# Altium footprint library 9-Pcblib_Con.PcbLib: 266 footprints (part 14 of 17)
Each footprint in its own frame and in the unit in brackets; x right, y up, seen from the top. Pads: shape width x height; smd on the part's side, far side on the other; paste and mask are expansions set on the pad; w line width, h text height; cw(c..) or ccw(c..) is an arc to the next point about the centre after c.
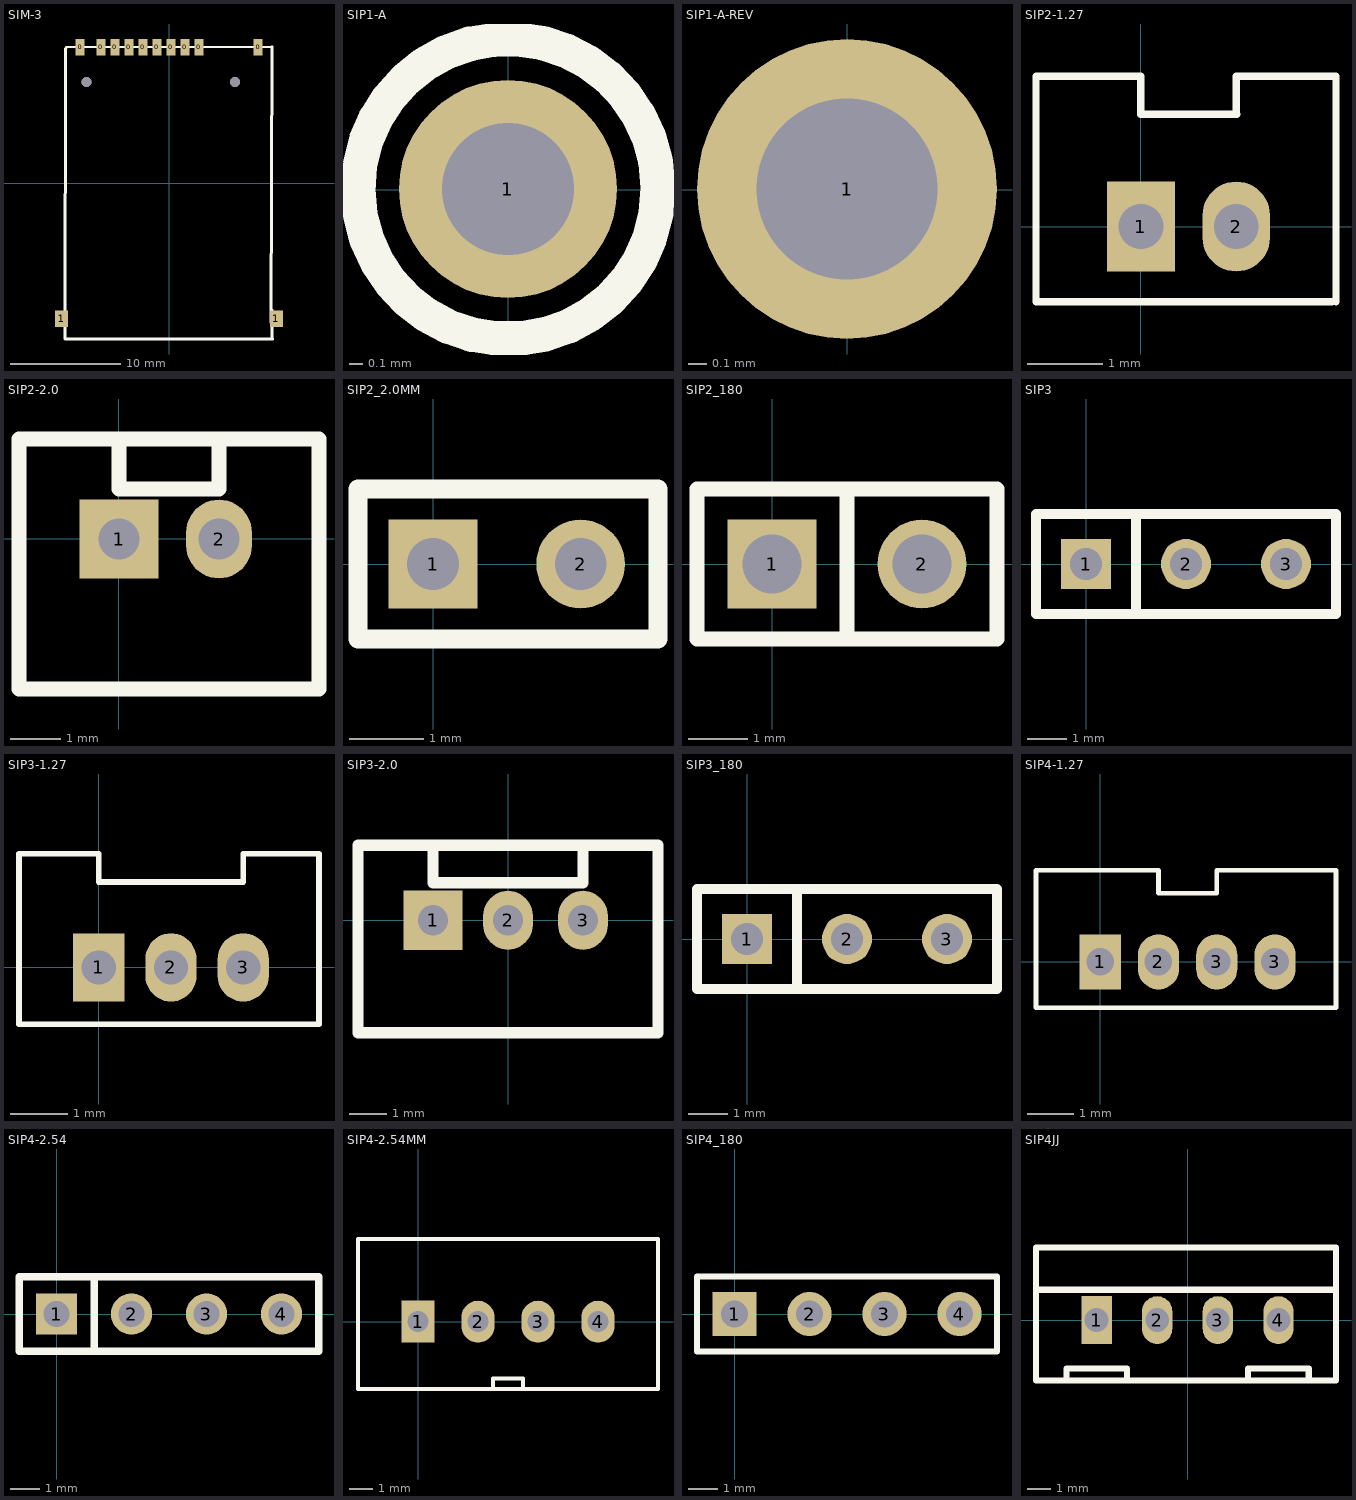
[diagram p13: the footprints below, top view; thin cyan lines are the x and y axes]

## SIM-3 [mm]
pads (12):
  rect 0.8x1.5 smd: 0(-8.07,12.325) 0(-6.17,12.325) 0(-4.9,12.325) 0(-3.63,12.325) 0(-2.36,12.325) 0(-1.09,12.325) 0(0.18,12.325) 0(1.45,12.325) 0(2.72,12.325) 0(8.08,12.325)
  rect 1.2x1.5 smd: 1(-9.75,-12.325) 1(9.75,-12.325)
via 6,9.175 diameter 0.9 hole 0.9
via -7.5,9.175 diameter 0.9 hole 0.9
Top Overlay:
  lines w0.254: 7.778,12.325 9.353,12.375 ; 9.251,-12.618 9.353,12.375 ; 9.353,-11.501 9.353,-14.091 9.404,-14.142 8.642,-14.142 -9.443,-14.142 -9.392,12.223 -9.291,12.325 9.353,12.375

## SIP1-A [mil]
pads (1):
  round 63 hole 38: 1(-0.06,0.21)
Top Overlay:
  lines w10: 43.25,0.21 cw(c-0.06,0.21) 43.24,0.94

## SIP1-A-REV [mil]
pads (1):
  round 63 hole 38: 1(-0.06,0.21)

## SIP2-1.27 [mm]
height 4.57
pads (2):
  rect 0.9x1.2 hole 0.6: 1(0,0)
  oval 0.9x1.2 hole 0.6: 2(1.27,0)
Top Overlay:
  lines w0.1: 1.27,1.5 1.27,2 2.6,2 2.6,-1 ; 1.278,1.5 0,1.5 0,2 -1.4,2 -1.4,-1 2.54,-1

## SIP2-2.0 [mil]
pads (2):
  rect 62x62 / inner rect 52x52 / far side rect 62x62 hole 32: 1(0.35,-0.1)
  oval 52x62 / inner round 52 / far side oval 52x62 hole 32: 2(79.09,-0.1)
Top Overlay:
  lines w11.81: 0.35,78.64 0.35,39.27 79.09,39.27 79.09,78.64 ; -78.39,-118.21 157.83,-118.21 157.83,78.64 -78.39,78.64 -78.39,-0.1 -78.39,-118.21

## SIP2_2.0MM [mm]
pads (2):
  rect 1.2x1.2 hole 0.7: 1(0,0)
  round 1.2 hole 0.7: 2(2,0)
Top Overlay:
  lines w0.254: -1.016,-1.016 -1.016,1.016 3.048,1.016 3.048,-1.016 -1.016,-1.016

## SIP2_180 [mm]
height 5.08
pads (2):
  rect 1.5x1.5 hole 1: 1(0,0)
  round 1.5 hole 1: 2(2.54,0)
Top Overlay:
  lines w0.254: 1.27,-1.27 1.27,1.27 ; -1.27,-1.27 -1.27,1.27 3.81,1.27 3.81,-1.27 -1.27,-1.27
3D body: height 8.54, standoff -3, extent -1.27,-1.27 3.81,1.27

## SIP3 [mil]
pads (3):
  rect 50x50 hole 32: 1(0,0)
  round 50 hole 32: 2(100,0) 3(200,0)
Top Overlay:
  lines w10: 50,-50 50,50 ; -50,-50 250,-50 250,50 -50,50 -50,-50

## SIP3-1.27 [mm]
height 4.57
pads (3):
  rect 0.9x1.2 hole 0.6: 1(0,0)
  oval 0.9x1.2 hole 0.6: 2(1.27,0) 3(2.54,0)
Top Overlay:
  lines w0.1: -1.4,-1 3.87,-1 3.87,2 2.54,2 2.54,1.5 0,1.5 0,2 -1.4,2 -1.4,-1

## SIP3-2.0 [mil]
pads (3):
  rect 62x62 / inner rect 52x52 / far side rect 62x62 hole 32: 1(-78.74,0)
  oval 52x62 / inner round 52 / far side oval 52x62 hole 32: 2(0,0) 3(78.74,0)
Top Overlay:
  lines w11.81: -78.74,78.74 -78.74,39.37 78.74,39.37 78.74,78.74 ; -157.48,-118.11 -157.48,0 -157.48,78.74 157.48,78.74 157.48,-118.11 -157.48,-118.11

## SIP3_180 [mil]
height 200
pads (3):
  rect 50x50 hole 32: 1(0,0)
  round 50 hole 32: 2(100,0) 3(200,0)
Top Overlay:
  lines w10: 50,-50 50,50 ; -50,-50 -50,50 250,50 250,-50 -50,-50
3D body: height 336.22, standoff -118.11, extent -49.99,-49.99 250.01,50.01

## SIP4-1.27 [mm]
height 4.57
pads (4):
  rect 0.9x1.2 hole 0.6: 1(0,0)
  oval 0.9x1.2 hole 0.6: 2(1.27,0) 3(2.54,0) 3(3.81,0)
Top Overlay:
  lines w0.1: -1.4,-1 -1.4,2 1.27,2 1.27,1.5 2.54,1.5 2.54,2 5.14,2 5.14,-1 -1.4,-1

## SIP4-2.54 [mil]
pads (4):
  rect 55x55 hole 35: 1(0,0)
  round 55 hole 35: 2(100,0) 3(200,0) 4(300,0)
Top Overlay:
  lines w10: 50,-50 50,50 ; -50,-50 -50,50 350,50 350,-50 -50,-50
3D body: height 344.09, standoff -110.24, extent -50,-50 350,48.03

## SIP4-2.54MM [mil]
pads (4):
  rect 55x70 hole 35: 1(0,0)
  oval 55x70 hole 35: 2(100,0) 3(200,0) 4(300,0)
Top Overlay:
  lines w7: 125,-112.2 125,-94.49 175,-94.49 175,-112.2 ; -100,-112.2 -100,137.8 400,137.8 400,-112.2 -100,-112.2

## SIP4_180 [mm] "Connector; Heade"
height 5.08
pads (4):
  rect 1.5x1.5 hole 0.9: 1(0,0)
  round 1.5 hole 0.9: 2(2.54,0) 3(5.08,0) 4(7.62,0)
Top Overlay:
  lines w0.2: -1.27,-1.27 8.89,-1.27 8.89,1.27 -1.27,1.27 -1.27,-1.27
3D body: height 8.54, standoff -3, extent -1.27,-1.27 8.89,1.27

## SIP4JJ [mm]
pads (4):
  rect 1.27x2 hole 1: 1(-3.81,0)
  oval 1.27x2 hole 1: 2(-1.27,0) 3(1.27,0) 4(3.81,0)
Top Overlay:
  lines w0.254: -6.35,1.27 -5.08,1.27 2.54,1.27 3.81,1.27 6.096,1.27 ; -5.08,-2.54 -5.08,-2.032 -2.54,-2.032 -2.54,-2.54 ; -5.08,3.048 2.54,3.048 ; 2.54,-2.54 2.54,-2.032 5.08,-2.032 5.08,-2.54 ; -6.35,-2.54 -6.35,3.048 6.223,3.048 6.223,-2.54 -6.35,-2.54
3D body: height 11.68, standoff -3.56, extent -5.118,-3.175 5.042,3.175